# Altium footprint library SMT.PcbLib: 325 footprints (part 16 of 21)
Each footprint in its own frame and in the unit in brackets; x right, y up, seen from the top. Pads: shape width x height; smd on the part's side, far side on the other; paste and mask are expansions set on the pad; w line width, h text height; cw(c..) or ccw(c..) is an arc to the next point about the centre after c.
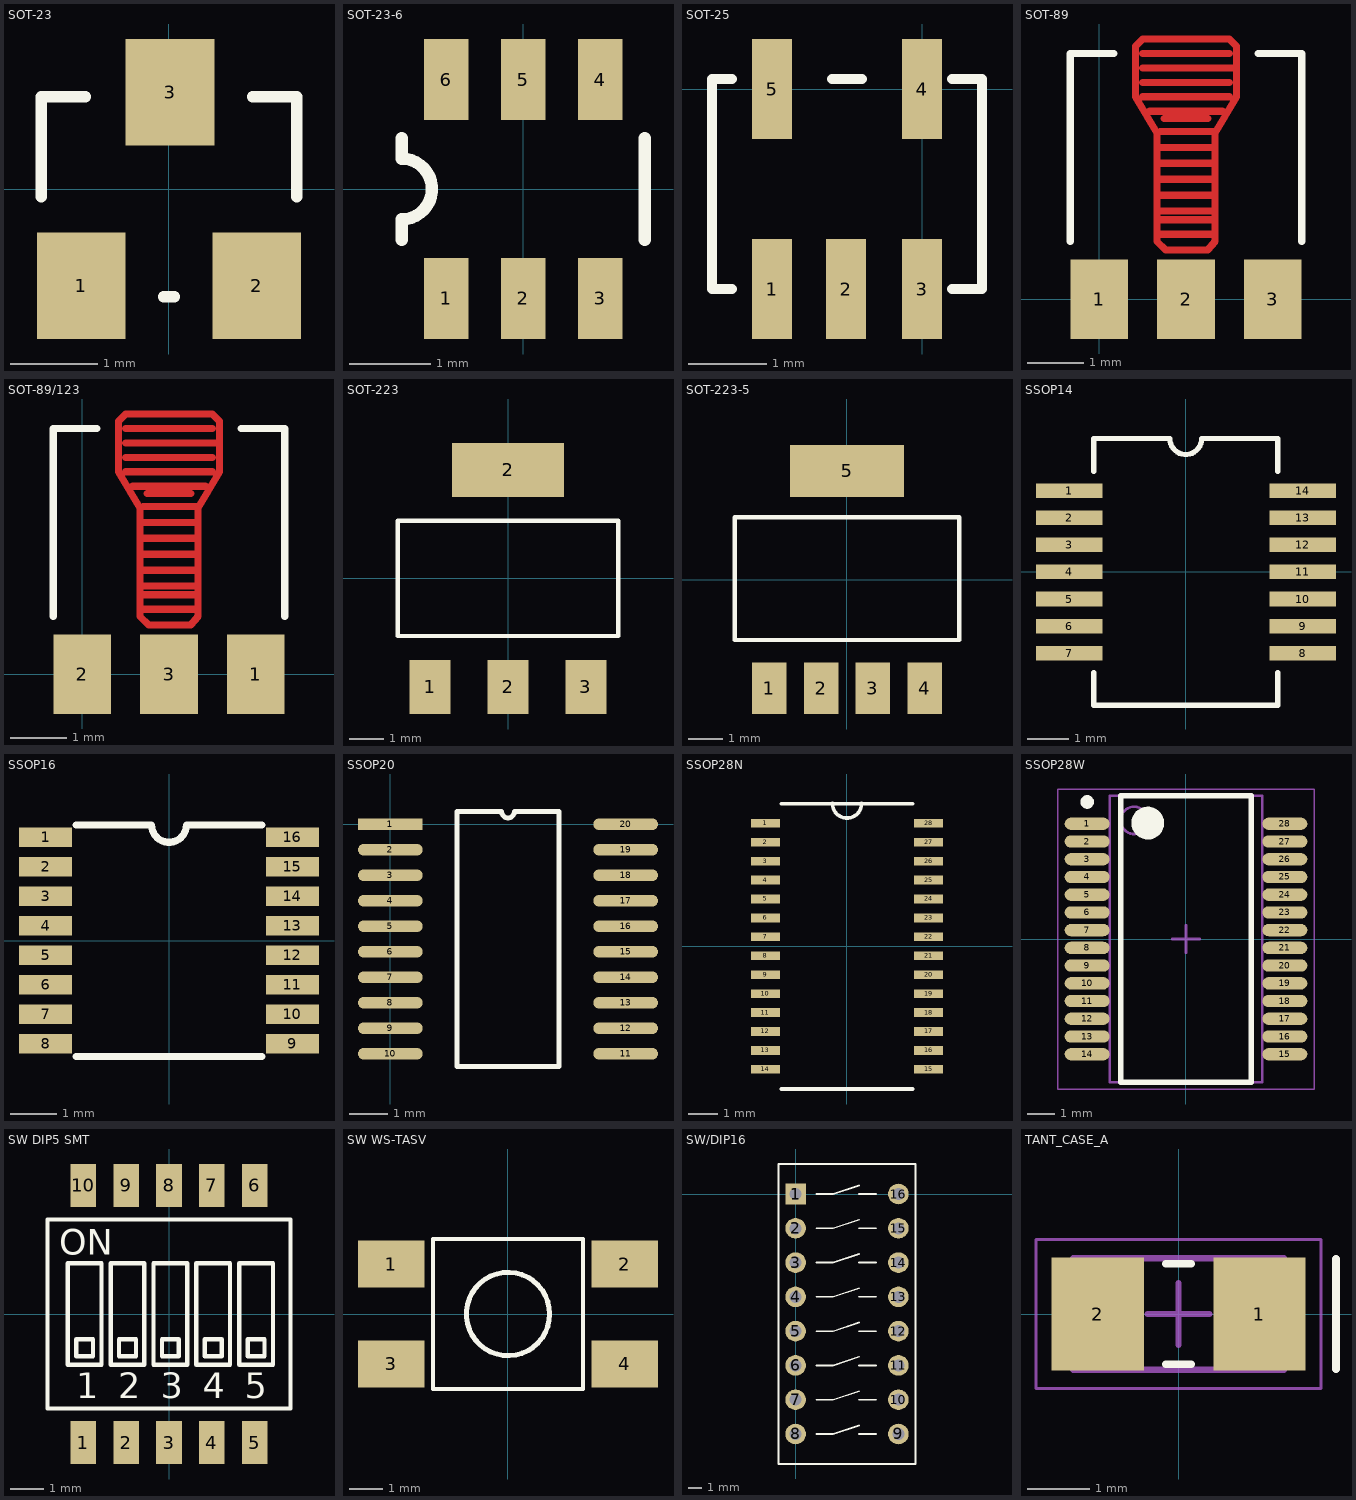
[diagram p15: the footprints below, top view; thin cyan lines are the x and y axes]

## SOT-23 [mil]
pads (3):
  rect 40x48 smd: 1(-39.5,-43.5) 2(39.5,-43.5) 3(0.5,43.5)
TopOverlay:
  lines w5: -57.5,-3.5 -57.5,41.5 -37.5,41.5 ; -2.5,-48.5 2.5,-48.5 ; 37.5,41.5 57.5,41.5 57.5,-3.5
3D body: height 39.37, standoff 0, extent -59.05,-27.06 59.06,27.07
3D body: height 31.5, standoff 19.68, extent -46.75,-46.26 -31.99,-26.57
3D body: height 11.81, standoff 0, extent -46.75,-62.99 -31.99,-46.26
3D body: height 19.68, standoff 0, extent -46.75,-46.26 -31.99,-36.42
3D body: height 19.68, standoff 0, extent 31.99,-46.26 46.75,-36.42
3D body: height 11.81, standoff 0, extent 31.99,-62.99 46.75,-46.26
3D body: height 31.5, standoff 19.68, extent 31.99,-46.26 46.75,-26.57
3D body: height 19.68, standoff 0, extent -7.38,36.42 7.38,46.26
3D body: height 11.81, standoff 0, extent -7.38,46.26 7.38,62.99
3D body: height 31.5, standoff 19.68, extent -7.38,26.57 7.38,46.26

## SOT-23-6 [mm] "6 PIN"
height 1.45
pads (6):
  rect 0.55x1 smd: 1(-0.95,-1.35) 2(0,-1.35) 3(0.95,-1.35) 4(0.95,1.35) 5(0,1.35) 6(-0.95,1.35)
TopOverlay:
  lines w0.152: -1.5,-0.625 -1.5,-0.375 ccw(c-1.5,0) -1.5,0.375 -1.5,0.625 ; 1.5,-0.625 1.5,0 1.5,0.625
3D body: height 1.45, standoff 0, extent -1.5,-0.875 1.5,0.875

## SOT-25 [mil]
pads (5):
  rect 20x50 smd: 1(-75,-100) 2(-38,-100) 3(0,-100) 4(0,0) 5(-75,0)
TopOverlay:
  lines w5: -95,-100 -105,-100 -105,5 -95,5 ; -45,5 -30,5 ; 15,-100 30,-100 30,5 15,5

## SOT-89 [mil]
pads (3):
  rect 40x55 smd: 1(0,0) 2(60,0) 3(120,0)
TopLayer:
  lines w5: 30,140 90,140 ; 30,150 90,150 ; 30,160 95,160 ; 30,170 90,170 ; 35,130 85,130 ; 40,45 80,45 ; 40,55 80,55 ; 42,61 79,61 ; 42,72 79,72 ; 42,83 79,83 ; 42,94 79,94 ; 42,105 79,105 ; 42,116 79,116 ; 45,125 75,125 ; 25,140 40,115 40,40 46,34 75,34 80,40 80,115 95,140 95,175 90,180 30,180 25,175 25,140
TopOverlay:
  lines w5: -20,40 -20,170 10,170 ; 110,170 140,170 140,40
TopSolder:
  lines w5: 30,180 25,175 25,140 95,140 95,175 90,180 35,180 35,145 ; 45,145 45,175 ; 55,145 55,180 ; 65,145 65,175 ; 75,140 75,180 ; 85,145 85,180

## SOT-89/123 [mil]
pads (3):
  rect 40x55 smd: 1(120,0) 2(0,0) 3(60,0)
TopLayer:
  lines w5: 30,140 90,140 ; 30,150 90,150 ; 30,160 95,160 ; 30,170 90,170 ; 35,130 85,130 ; 40,45 80,45 ; 40,55 80,55 ; 42,61 79,61 ; 42,72 79,72 ; 42,83 79,83 ; 42,94 79,94 ; 42,105 79,105 ; 42,116 79,116 ; 45,125 75,125 ; 25,140 40,115 40,40 46,34 75,34 80,40 80,115 95,140 95,175 90,180 30,180 25,175 25,140
TopOverlay:
  lines w5: -20,40 -20,170 10,170 ; 110,170 140,170 140,40
TopSolder:
  lines w5: 30,180 25,175 25,140 95,140 95,175 90,180 35,180 35,145 ; 45,145 45,175 ; 55,145 55,180 ; 65,145 65,175 ; 75,140 75,180 ; 85,145 85,180

## SOT-223 [mm]
pads (4):
  rect 1.2x1.6 smd: 1(-2.3,-3.2) 2(0,-3.2) 3(2.3,-3.2)
  rect 3.3x1.6 smd: 2(0,3.2)
TopOverlay:
  lines w0.127: -3.25,-1.7 -3.25,1.7 3.25,1.7 3.25,-1.7 -3.25,-1.7
3D body: height 1.65, standoff 0, extent -3.25,-1.7 3.25,1.7
3D body: height 0.82, standoff 0.58, extent -2.7,-2.5 -1.9,-1.7
3D body: height 0.82, standoff 0, extent -2.7,-2.7 -1.9,-2.5
3D body: height 0.25, standoff 0, extent -2.7,-3.6 -1.9,-2.7
3D body: height 0.25, standoff 0, extent -0.4,-3.6 0.4,-2.7
3D body: height 0.82, standoff 0, extent -0.4,-2.7 0.4,-2.5
3D body: height 0.82, standoff 0.58, extent -0.4,-2.5 0.4,-1.7
3D body: height 0.25, standoff 0, extent 1.9,-3.6 2.7,-2.7
3D body: height 0.82, standoff 0, extent 1.9,-2.7 2.7,-2.5
3D body: height 0.82, standoff 0.58, extent 1.9,-2.5 2.7,-1.7
3D body: height 0.25, standoff 0, extent -1.5,2.7 1.5,3.6
3D body: height 0.82, standoff 0, extent -1.5,2.5 1.5,2.7
3D body: height 0.82, standoff 0.58, extent -1.5,1.7 1.5,2.5

## SOT-223-5 [mm]
height 1.8
pads (5):
  rect 1x1.5 smd: 1(-2.25,-3.15) 2(-0.75,-3.15) 3(0.75,-3.15) 4(2.25,-3.15)
  rect 3.3x1.5 smd: 5(0,3.15)
TopOverlay:
  lines w0.127: -3.25,-1.753 -3.25,1.807 3.25,1.807 3.25,-1.753 0,-1.753 -3.25,-1.753

## SSOP14 [mm] "SOP, 14-Leads, Body 6.20x5.30mm, Pitch 0.65mm, IPC Medium Density"
height 2
pads (14):
  rect 1.6x0.35 smd: 1(-2.8,1.95) 2(-2.8,1.3) 3(-2.8,0.65) 4(-2.8,0) 5(-2.8,-0.65) 6(-2.8,-1.3) 7(-2.8,-1.95) 8(2.8,-1.95) 9(2.8,-1.3) 10(2.8,-0.65) 11(2.8,0) 12(2.8,0.65) 13(2.8,1.3) 14(2.8,1.95)
TopOverlay:
  lines w0.127: -2.212,-2.413 -2.212,-3.2 2.2,-3.2 2.2,-2.413 ; -2.212,2.413 -2.212,3.2 -0.387,3.2 ccw(c-0.006,3.2) 0.375,3.2 2.2,3.2 2.2,2.413
3D body: height 2, standoff 0.05, extent -2.21,-3.2 2.21,3.2

## SSOP16 [mil] "16-LEAD PLASTIC SSOP GN PACKAGE"
height 78.74
pads (16):
  rect 45x16.54 smd: 1(-104.5,87.5) 2(-104.5,62.5) 3(-104.5,37.5) 4(-104.5,12.5) 5(-104.5,-12.5) 6(-104.5,-37.5) 7(-104.5,-62.5) 8(-104.5,-87.5) 9(104.5,-87.5) 10(104.5,-62.5) 11(104.5,-37.5) 12(104.5,-12.5) 13(104.5,12.5) 14(104.5,37.5) 15(104.5,62.5) 16(104.5,87.5)
TopOverlay:
  lines w6: -78.5,-97.99 78.5,-97.99 ; -78.5,97.99 -14.76,97.99 ccw(c0,97.99) 14.76,97.99 78.5,97.99

## SSOP20 [mil]
height 78.74
pads (20):
  rect 66x12 smd: 1(0,0)
  oval 66x12 smd: 2(0,-26) 3(0,-52) 4(0,-78) 5(0,-104) 6(0,-130) 7(0,-156) 8(0,-182) 9(0,-208) 10(0,-234) 11(240,-234) 12(240,-208) 13(240,-182) 14(240,-156) 15(240,-130) 16(240,-104) 17(240,-78) 18(240,-52) 19(240,-26) 20(240,0)
TopOverlay:
  lines w5: 68,-247 68,13 113.5,13 ccw(c120,13) 126.5,13 172,13 172,-247 68,-247

## SSOP28N [mm]
pads (28):
  rect 1x0.3 smd: 1(-2.8,4.225) 2(-2.8,3.575) 3(-2.8,2.925) 4(-2.8,2.275) 5(-2.8,1.625) 6(-2.8,0.975) 7(-2.8,0.325) 8(-2.8,-0.325) 9(-2.8,-0.975) 10(-2.8,-1.625) 11(-2.8,-2.275) 12(-2.8,-2.925) 13(-2.8,-3.575) 14(-2.8,-4.225) 15(2.8,-4.225) 16(2.8,-3.575) 17(2.8,-2.925) 18(2.8,-2.275) 19(2.8,-1.625) 20(2.8,-0.975) 21(2.8,-0.325) 22(2.8,0.325) 23(2.8,0.975) 24(2.8,1.625) 25(2.8,2.275) 26(2.8,2.925) 27(2.8,3.575) 28(2.8,4.225)
TopOverlay:
  lines w0.127: -2.25,-4.9 2.25,-4.9 ; -2.25,4.9 2.25,4.9 ; -0.5,4.902 ccw(c0,4.902) 0.5,4.902

## SSOP28W [mm]
height 2
pads (28):
  oval 1.65x0.45 smd: 1(-3.625,4.225) 2(-3.625,3.575) 3(-3.625,2.925) 4(-3.625,2.275) 5(-3.625,1.625) 6(-3.625,0.975) 7(-3.625,0.325) 8(-3.625,-0.325) 9(-3.625,-0.975) 10(-3.625,-1.625) 11(-3.625,-2.275) 12(-3.625,-2.925) 13(-3.625,-3.575) 14(-3.625,-4.225) 15(3.625,-4.225) 16(3.625,-3.575) 17(3.625,-2.925) 18(3.625,-2.275) 19(3.625,-1.625) 20(3.625,-0.975) 21(3.625,-0.325) 22(3.625,0.325) 23(3.625,0.975) 24(3.625,1.625) 25(3.625,2.275) 26(3.625,2.925) 27(3.625,3.575) 28(3.625,4.225)
TopOverlay:
  circle w0.6: c-1.4,4.25 r0.3
  circle w0.25: c-3.625,5.025 r0.125
  lines w0.2: -2.4,-5.25 2.4,-5.25 2.4,5.25 -2.4,5.25 -2.4,-5.25
Mechanical13:
  circle w0.1: c-1.9,4.35 r0.5
  lines w0.1: -2.8,-5.25 2.8,-5.25 2.8,5.25 -2.8,5.25 -2.8,-5.25
Mechanical15:
  lines w0.05: -4.7,-5.5 4.7,-5.5 4.7,5.5 -4.7,5.5 -4.7,-5.5
  lines w0.1: -0.5,0 0.5,0 ; 0,-0.5 0,0.5
3D body: height 2, standoff 0.25, extent -2.8,-5.25 2.8,5.25

## SW DIP5 SMT [mm] "WS-DISV, SMD version"
height 2
pads (10):
  rect 0.76x1.27 smd: 1(-2.54,-3.81) 2(-1.27,-3.81) 3(0,-3.81) 4(1.27,-3.81) 5(2.54,-3.81) 6(2.54,3.81) 7(1.27,3.81) 8(0,3.81) 9(-1.27,3.81) 10(-2.54,3.81)
TopOverlay:
  lines w0.127: -3.6,-2.8 -3.6,0 -3.6,2.8 3.6,2.8 3.6,0 3.6,-2.8 -3.6,-2.8 ; -3,-1.5 -2,-1.5 -2,1.5 -3,1.5 -3,-1.5 ; -2.75,-1.25 -2.75,-0.75 -2.25,-0.75 -2.25,-1.25 -2.75,-1.25 ; -1.73,-1.5 -1.73,1.5 -0.73,1.5 -0.73,-1.5 -1.73,-1.5 ; -1.48,-1.25 -0.98,-1.25 -0.98,-0.75 -1.48,-0.75 -1.48,-1.25 ; -0.46,-1.5 -0.46,1.5 0.54,1.5 0.54,-1.5 -0.46,-1.5 ; -0.21,-1.25 0.29,-1.25 0.29,-0.75 -0.21,-0.75 -0.21,-1.25 ; 0.81,-1.5 0.81,1.5 1.81,1.5 1.81,-1.5 0.81,-1.5 ; 1.06,-1.25 1.56,-1.25 1.56,-0.75 1.06,-0.75 1.06,-1.25 ; 2.08,-1.5 2.08,1.5 3.08,1.5 3.08,-1.5 2.08,-1.5 ; 2.33,-1.25 2.83,-1.25 2.83,-0.75 2.33,-0.75 2.33,-1.25
  text "5" at 2.25,-2.5 h0.76
  text "4" at 1,-2.5 h0.76
  text "3" at -0.25,-2.5 h0.76
  text "2" at -1.5,-2.5 h0.76
  text "1" at -2.75,-2.5 h0.76
  text "ON" at -3.25,1.75 h0.76
3D body: height 2, standoff 0, extent -3.6,-2.8 3.6,2.8

## SW WS-TASV [mm] "4.5X4.5mm Tact Switch, SMD version"
height 3.8
pads (4):
  rect 2x1.4 smd: 1(-3.5,1.5) 2(3.5,1.5) 3(-3.5,-1.5) 4(3.5,-1.5)
TopOverlay:
  circle w0.152: c0,0 r1.25
  lines w0.127: -2.25,-2.25 2.25,-2.25 2.25,2.25 -2.25,2.25 -2.25,-2.25
3D body: height 2.9, standoff 0, extent -2.25,-2.25 2.25,2.25
3D body: height 3.8, standoff 2.9, extent -1.249,-1.25 1.25,1.25

## SW/DIP16 [mil]
pads (16):
  rect 60x60 hole 35: 1(0,0)
  round 60 hole 35: 2(0,-100) 3(0,-200) 4(0,-300) 5(0,-400) 6(0,-500) 7(0,-600) 8(0,-700) 9(300,-700) 10(300,-600) 11(300,-500) 12(300,-400) 13(300,-300) 14(300,-200) 15(300,-100) 16(300,0)
TopOverlay:
  lines w5: 60,-700 110,-700 185,-675 ; 60,-600 110,-600 185,-575 ; 60,-500 110,-500 185,-475 ; 60,-400 110,-400 185,-375 ; 60,-300 110,-300 185,-275 ; 60,-200 110,-200 185,-175 ; 60,-100 110,-100 185,-75 ; 60,0 110,0 185,25 ; 185,-700 235,-700 ; 185,-600 235,-600 ; 185,-500 235,-500 ; 185,-400 235,-400 ; 185,-300 235,-300 ; 185,-200 235,-200 ; 185,-100 235,-100 ; 185,0 235,0 ; -50,-787.5 -50,87.5 350,87.5 350,-787.5 -50,-787.5
BottomOverlay:
  circle w20: c62,0 r12

## TANT_CASE_A [mm]
pads (2):
  rect 1.49x1.82 smd: 1(1.305,0) 2(-1.305,0)
TopOverlay:
  lines w0.127: -0.2,-0.81 0.2,-0.81 ; -0.2,0.81 0.2,0.81 ; 2.54,-0.889 2.54,0 2.54,0.889
Mechanical13:
  lines w0.1: -1.7,-0.9 -1.7,0.9 1.7,0.9 1.7,-0.9 -1.7,-0.9
Mechanical15:
  lines w0.05: -2.3,-1.2 -2.3,1.2 2.3,1.2 2.3,-1.2 -2.3,-1.2
  lines w0.1: -0.5,0 0.5,0 ; 0,-0.5 0,0.5
3D body: height 1.8, standoff 0, extent -0.9,-0.9 0.9,0.9
3D body: height 1.8, standoff 0, extent 0.9,-0.9 1.7,0.9
3D body: height 1.8, standoff 0, extent -1.7,-0.9 -0.9,0.9